# Altium footprint library ADP_Misc.PcbLib: 41 footprints (part 2 of 3)
Each footprint in its own frame and in the unit in brackets; x right, y up, seen from the top. Pads: shape width x height; smd on the part's side, far side on the other; paste and mask are expansions set on the pad; w line width, h text height; cw(c..) or ccw(c..) is an arc to the next point about the centre after c.
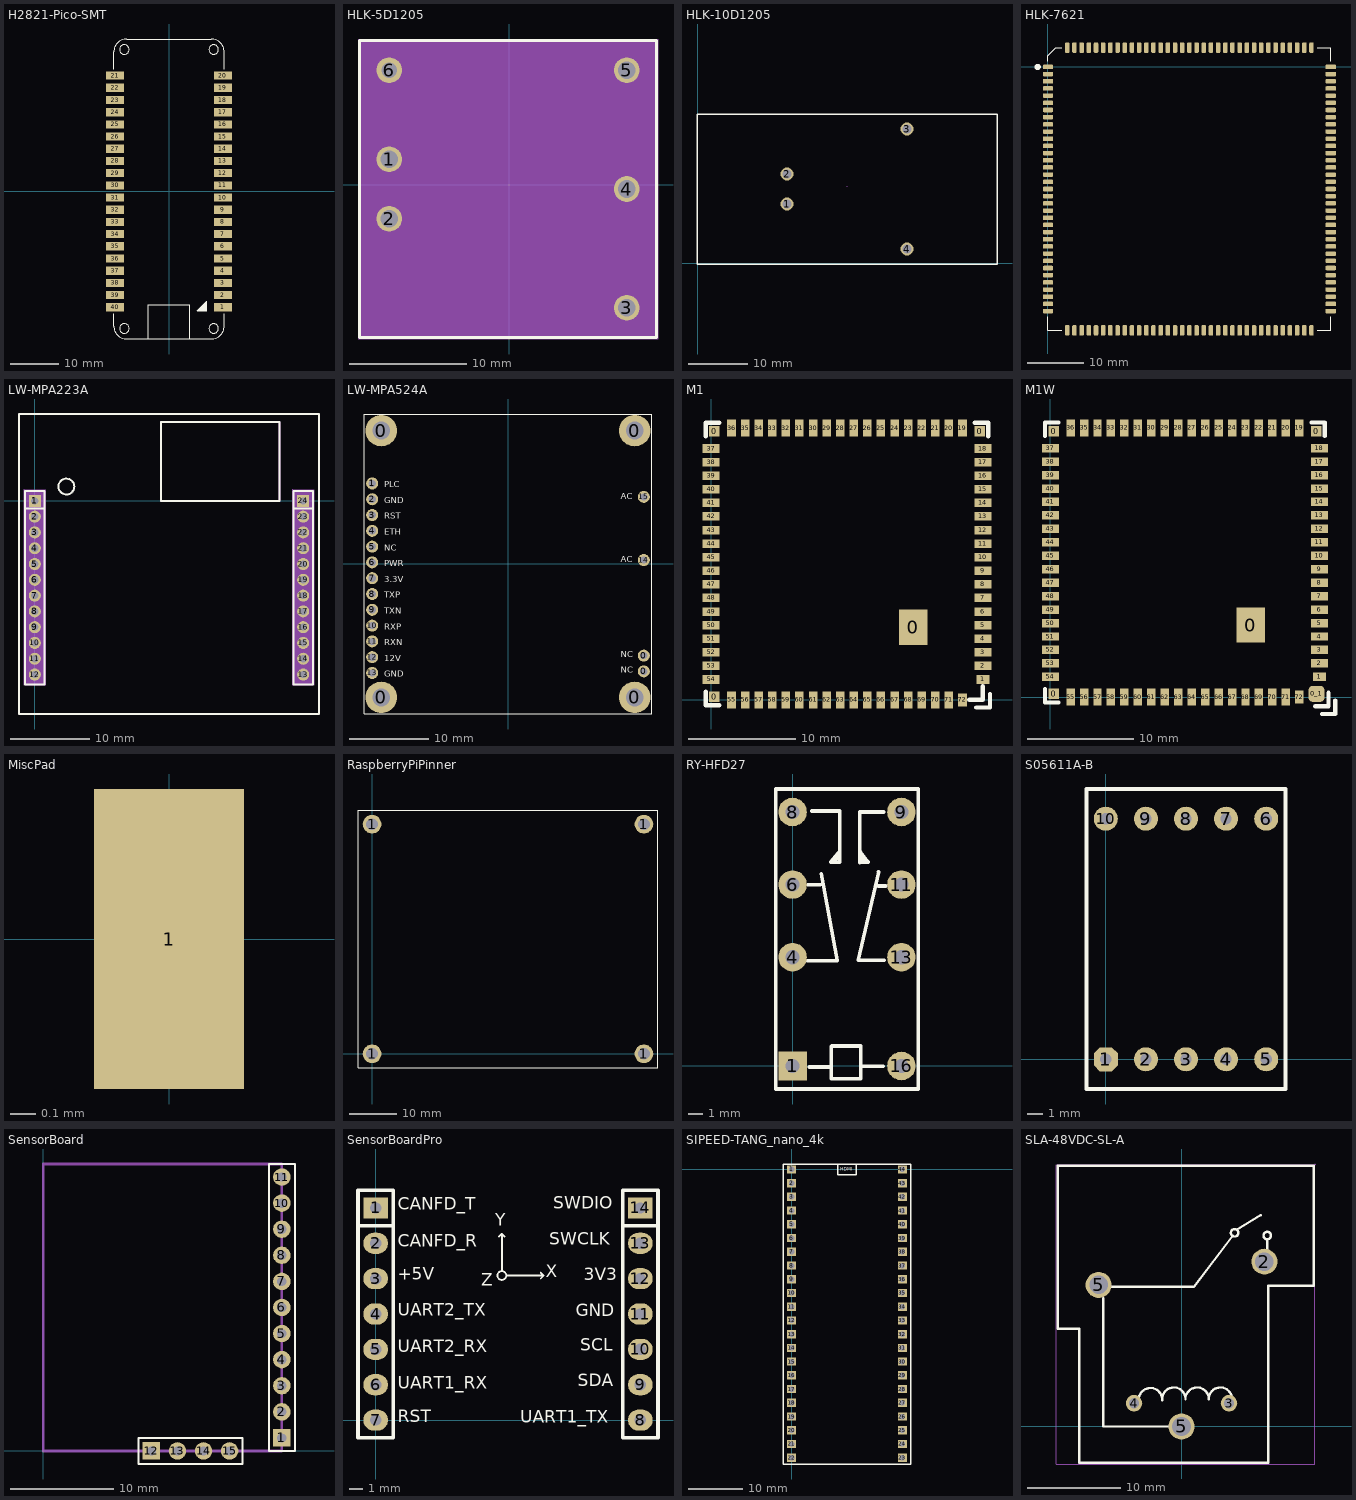
[diagram p1: the footprints below, top view; thin cyan lines are the x and y axes]

## H2821-Pico-SMT [mm]
pads (40):
  rect 3.8x1.7 smd mask+0.102: 1(11.246,-24.13) 2(11.246,-21.59) 3(11.246,-19.05) 4(11.246,-16.51) 5(11.246,-13.97) 6(11.246,-11.43) 7(11.246,-8.89) 8(11.246,-6.35) 9(11.246,-3.81) 10(11.246,-1.27) 11(11.246,1.27) 12(11.246,3.81) 13(11.246,6.35) 14(11.246,8.89) 15(11.246,11.43) 16(11.246,13.97) 17(11.246,16.51) 18(11.246,19.05) 19(11.246,21.59) 20(11.246,24.13) 21(-11.246,24.13) 22(-11.246,21.59) 23(-11.246,19.05) 24(-11.246,16.51) 25(-11.246,13.97) 26(-11.246,11.43) 27(-11.246,8.89) 28(-11.246,6.35) 29(-11.246,3.81) 30(-11.246,1.27) 31(-11.246,-1.27) 32(-11.246,-3.81) 33(-11.246,-6.35) 34(-11.246,-8.89) 35(-11.246,-11.43) 36(-11.246,-13.97) 37(-11.246,-16.51) 38(-11.246,-19.05) 39(-11.246,-21.59) 40(-11.246,-24.13)
Top Overlay:
  circle w0.102: c-9.312,29.568 r1
  circle w0.102: c9.308,29.568 r1
  circle w0.102: c9.308,-28.548 r1
  circle w0.102: c-9.308,-28.548 r1
  region: 5.842,-24.89 7.874,-24.89 7.874,-22.858
  lines w0.254: -11.5,-25.5 -11.5,-28.04 ccw(c-8.8,-28.04) -8.8,-30.74 8.8,-30.74 ccw(c8.8,-28.04) 11.5,-28.04 11.5,-25.5 ; -11.5,25.427 -11.5,29.06 cw(c-8.8,29.06) -8.8,31.76 8.8,31.76 cw(c8.8,29.06) 11.5,29.06 11.5,25.427 ; -4.318,-30.74 4.318,-30.74 4.318,-23.628 -4.318,-23.628 -4.318,-30.74 ; 5.842,-24.89 7.874,-24.89 7.874,-22.858 5.842,-24.89

## HLK-5D1205 [mil]
pads (6):
  round 86.61 hole 59.06: 1(-405,85) 2(-405,-115) 3(395,-415) 4(395,-15) 5(395,385)
  round 86.61 hole 52: 6(-405,385)
Top Overlay:
  lines w10: -505,-515 495,-515 495,485 -505,485 -505,-515
Mechanical 4:
  region: -510,490 500,490 500,-520 -510,-520
Mechanical 5:
  region: -448.31,128.31 -361.69,128.31 -361.69,41.69 -448.31,41.69
  region: -448.31,-71.69 -361.69,-71.69 -361.69,-158.31 -448.31,-158.31
  region: -448.31,428.31 -361.69,428.31 -361.69,341.69 -448.31,341.69
  region: 351.69,428.31 438.31,428.31 438.31,341.69 351.69,341.69
  region: 351.69,-371.69 438.31,-371.69 438.31,-458.31 351.69,-458.31
  region: 351.69,28.31 438.31,28.31 438.31,-58.31 351.69,-58.31
Mechanical 15:
  lines w0.1: -6,2.75 -4,4.75

## HLK-10D1205 [mm]
pads (4):
  round 2.2 hole 1.5: 1(15.113,10.033) 2(15.113,15.113) 3(35.433,22.733) 4(35.433,2.413)
Top Overlay:
  lines w0.254: -0.127,-0.127 50.673,-0.127 50.673,25.273 -0.127,25.273 -0.127,-0.127
Mechanical 15:
  lines w0.003: 25.273,13.049 25.273,13.05

## HLK-7621 [mm]
height 1
pads (141):
  rrect50% 1.85x0.8 smd: 1(0,0) 2(0,-1.27) 3(0,-2.54) 4(0,-3.81) 5(0,-5.08) 6(0,-6.35) 7(0,-7.62) 8(0,-8.89) 9(0,-10.16) 10(0,-11.43) 11(0,-12.7) 12(0,-13.97) 13(0,-15.24) 14(0,-16.51) 15(0,-17.78) 16(0,-19.05) 17(0,-20.32) 18(0,-21.59) 19(0,-22.86) 20(0,-24.13) 21(0,-25.4) 22(0,-26.67) 23(0,-27.94) 24(0,-29.21) 25(0,-30.48) 26(0,-31.75) 27(0,-33.02) 28(0,-34.29) 29(0,-35.56) 30(0,-36.83) 31(0,-38.1) 32(0,-39.37) 33(0,-40.64) 34(0,-41.91) 35(0,-43.18) 71(50,-43.18) 72(50,-41.91) 73(50,-40.64) 74(50,-39.37) 75(50,-38.1) 76(50,-36.83) 77(50,-35.56) 78(50,-34.29) 79(50,-33.02) 80(50,-31.75) 81(50,-30.48) 82(50,-29.21) 83(50,-27.94) 84(50,-26.67) 85(50,-25.4) 86(50,-24.13) 87(50,-22.86) 88(50,-21.59) 89(50,-20.32) 90(50,-19.05) 91(50,-17.78) 92(50,-16.51) 93(50,-15.24) 94(50,-13.97) 95(50,-12.7) 96(50,-11.43) 97(50,-10.16) 98(50,-8.89) 99(50,-7.62) 100(50,-6.35) 101(50,-5.08) 102(50,-3.81) 103(50,-2.54) 104(50,-1.27) 105(50,0)
  rrect50% 0.8x1.85 smd: 36(3.41,-46.59) 37(4.68,-46.59) 38(5.95,-46.59) 39(7.22,-46.59) 40(8.49,-46.59) 41(9.76,-46.59) 42(11.03,-46.59) 43(12.3,-46.59) 44(13.57,-46.59) 45(14.84,-46.59) 46(16.11,-46.59) 47(17.38,-46.59) 48(18.65,-46.59) 49(19.92,-46.59) 50(21.19,-46.59) 51(22.46,-46.59) 52(23.73,-46.59) 53(25,-46.59) 54(26.27,-46.59) 55(27.54,-46.59) 56(28.81,-46.59) 56(28.81,-46.59) 57(30.08,-46.59) 58(31.35,-46.59) 59(32.62,-46.59) 60(33.89,-46.59) 61(35.16,-46.59) 62(36.43,-46.59) 63(37.7,-46.59) 64(38.97,-46.59) 65(40.24,-46.59) 66(41.51,-46.59) 67(42.78,-46.59) 68(44.05,-46.59) 69(45.32,-46.59) 70(46.59,-46.59) 106(46.59,3.41) 107(45.32,3.41) 108(44.05,3.41) 109(42.78,3.41) 110(41.51,3.41) 111(40.24,3.41) 112(38.97,3.41) 113(37.7,3.41) 114(36.43,3.41) 115(35.16,3.41) 116(33.89,3.41) 117(32.62,3.41) 118(31.35,3.41) 119(30.08,3.41) 120(28.81,3.41) 121(27.54,3.41) 122(26.27,3.41) 123(25,3.41) 124(23.73,3.41) 125(22.46,3.41) 126(21.19,3.41) 127(19.92,3.41) 128(18.65,3.41) 129(17.38,3.41) 130(16.11,3.41) 131(14.84,3.41) 132(13.57,3.41) 133(12.3,3.41) 134(11.03,3.41) 135(9.76,3.41) 136(8.49,3.41) 137(7.22,3.41) 138(5.95,3.41) 139(4.68,3.41) 140(3.41,3.41)
Top Overlay:
  circle w0.5: c-1.82,-0.014 r0.3
  lines w0.15: 0,-44.18 0,-46.59 2.41,-46.59 ; 0,1 0,2 1.41,3.41 2.41,3.41 ; 47.59,-46.59 50,-46.59 50,-44.18 ; 47.59,3.41 50,3.41 50,1

## LW-MPA223A [mil]
pads (24):
  rect 60x60 hole 35.43: 1(0,0) 24(1338.58,0)
  round 60 hole 35.43: 2(0,-78.8) 3(0,-157.5) 4(0,-236.3) 5(0,-315) 6(0,-393.7) 7(0,-472.5) 8(0,-551.2) 9(0,-630) 10(0,-708.7) 11(0,-787.4) 12(0,-866.2) 13(1338.58,-866.2) 14(1338.58,-787.4) 15(1338.58,-708.7) 16(1338.58,-630) 17(1338.58,-551.2) 18(1338.58,-472.5) 19(1338.58,-393.7) 20(1338.58,-315) 21(1338.58,-236.3) 22(1338.58,-157.5) 23(1338.58,-78.8)
Top Overlay:
  circle w10: c157.48,71.26 r39.37
  lines w10: -49.21,-39.36 49.21,-39.36 ; 1289.37,-39.36 1387.79,-39.36 ; -78.74,-1062.99 0,-1062.99 1377.95,-1062.99 1417.32,-1062.99 1417.32,433.07 -78.74,433.07 -78.74,-1062.99 ; -49.21,-915.38 49.21,-915.38 49.2,-591 49.2,49.2 -49.21,49.18 -49.21,-915.38 ; 629.92,0 629.92,393.7 1220.47,393.7 1220.47,0 629.92,0 ; 1289.37,-915.38 1289.37,49.18 1387.79,49.18 1387.78,-591 1387.78,-915.4 1289.37,-915.38
Mechanical 1:
  lines w10: 629.92,0 1220.47,0 1220.47,393.7 629.92,393.7 629.92,0
Mechanical 4:
  region: 1392.79,54.2 1392.79,-920.4 1284.37,-920.4 1284.37,54.2
  region: 54.21,54.2 54.21,-920.4 -54.21,-920.4 -54.21,54.2
Mechanical 5:
  circle w13.78: c1338.58,-866.2 r6.89
  circle w13.78: c1338.58,-787.4 r6.89
  circle w13.78: c1338.58,-708.7 r6.89
  circle w13.78: c1338.58,-630 r6.89
  circle w13.78: c1338.58,-551.2 r6.89
  circle w13.78: c1338.58,-472.5 r6.89
  circle w13.78: c1338.58,-393.7 r6.89
  circle w13.78: c1338.58,-315 r6.89
  circle w13.78: c1338.58,-236.3 r6.89
  circle w13.78: c1338.58,-157.5 r6.89
  circle w13.78: c1338.58,-78.8 r6.89
  circle w13.78: c1338.58,0 r6.89
  circle w13.78: c0,0 r6.89
  circle w13.78: c0,-78.8 r6.89
  circle w13.78: c0,-157.5 r6.89
  circle w13.78: c0,-236.3 r6.89
  circle w13.78: c0,-315 r6.89
  circle w13.78: c0,-393.7 r6.89
  circle w13.78: c0,-472.5 r6.89
  circle w13.78: c0,-551.2 r6.89
  circle w13.78: c0,-630 r6.89
  circle w13.78: c0,-708.7 r6.89
  circle w13.78: c0,-787.4 r6.89
  circle w13.78: c0,-866.2 r6.89
Mechanical 6:
  circle w2.36: c1284.37,54.2 r1.18
  circle w2.36: c-54.21,54.2 r1.18
Mechanical 15:
  lines w0.1: 17.55,-431.51 19.55,-433.51 ; 1356.14,-431.51 1358.14,-433.51

## LW-MPA524A [mil]
height 51.18
pads (21):
  round 157.48 hole 88.58: 0(-631.89,-665.35) 0(-631.89,665.35) 0(631.89,665.35) 0(631.89,-665.35)
  round 60 hole 36: 0(677.17,-456.69) 0(677.17,-535.43) 1(-677.16,401.57) 2(-677.16,322.84) 3(-677.17,244.09) 4(-677.16,165.35) 5(-677.17,86.61) 6(-677.16,7.87) 7(-677.16,-70.87) 8(-677.16,-149.61) 9(-677.17,-228.35) 10(-677.17,-307.09) 11(-677.17,-385.83) 12(-677.17,-464.57) 13(-677.17,-543.31) 14(677.17,19.68) 15(677.16,334.65)
Top Overlay:
  lines w5: -716.54,-748.03 -716.54,748.03 716.54,748.03 716.53,-748.03 -716.54,-748.03
  text "NC" at 562.99,-543.31 h31.5
  text "NC" at 562.99,-464.57 h31.5
  text "AC" at 562.99,7.87 h31.5
  text "AC" at 562.99,322.83 h31.5
  text "GND" at -618.11,-562.99 h31.5
  text "RXN" at -618.11,-405.51 h31.5
  text "RXP" at -618.11,-326.77 h31.5
  text "TXN" at -618.11,-248.03 h31.5
  text "TXP" at -618.11,-169.29 h31.5
  text "3.3V" at -618.11,-90.55 h31.5
  text "PWR" at -618.11,-11.81 h31.5
  text "PLC" at -618.11,381.89 h31.5
  text "GND" at -618.11,303.15 h31.5
  text "RST" at -618.11,224.41 h31.5
  text "ETH" at -618.11,145.67 h31.5
  text "NC" at -618.11,66.93 h31.5
  text "12V" at -618.11,-484.25 h31.5
3D body "PLC.STEP": height 169.29, standoff -342.52, extent -728.34,-748.03 728.35,748.04

## M1 [mm]
height 8.2
pads (76):
  rect 1x1 smd mask+0.051: 0(0.3,0.3) 0(0.3,25.1) 0(25.1,25.1)
  rect 2.667x3.302 smd mask+0.051: 0(18.9,6.8)
  rect 1.2x0.8 smd mask+0.051: 1(25.4,1.905)
  rect 1.6x0.8 smd mask+0.051: 2(25.4,3.175) 3(25.4,4.445) 4(25.4,5.715) 5(25.4,6.985) 6(25.4,8.255) 7(25.4,9.525) 8(25.4,10.795) 9(25.4,12.065) 10(25.4,13.335) 11(25.4,14.605) 12(25.4,15.875) 13(25.4,17.145) 14(25.4,18.415) 15(25.4,19.685) 16(25.4,20.955) 17(25.4,22.225) 18(25.4,23.495) 37(0,23.495) 38(0,22.225) 39(0,20.955) 40(0,19.685) 41(0,18.415) 42(0,17.145) 43(0,15.875) 44(0,14.605) 45(0,13.335) 46(0,12.065) 47(0,10.795) 48(0,9.525) 49(0,8.255) 50(0,6.985) 51(0,5.715) 52(0,4.445) 53(0,3.175) 54(0,1.905)
  rect 0.8x1.6 smd mask+0.051: 19(23.495,25.4) 20(22.225,25.4) 21(20.955,25.4) 22(19.685,25.4) 23(18.415,25.4) 24(17.145,25.4) 25(15.875,25.4) 26(14.605,25.4) 27(13.335,25.4) 28(12.065,25.4) 29(10.795,25.4) 30(9.525,25.4) 31(8.255,25.4) 32(6.985,25.4) 33(5.715,25.4) 34(4.445,25.4) 35(3.175,25.4) 36(1.905,25.4) 55(1.905,0) 56(3.175,0) 57(4.445,0) 58(5.715,0) 59(6.985,0) 60(8.255,0) 61(9.525,0) 62(10.795,0) 63(12.065,0) 64(13.335,0) 65(14.605,0) 66(15.875,0) 67(17.145,0) 68(18.415,0) 69(19.685,0) 70(20.955,0) 71(22.225,0)
  rect 0.8x1.2 smd mask+0.051: 72(23.495,0)
Top Overlay:
  lines w0.4: -0.508,0.762 -0.508,-0.508 0.762,-0.508 ; -0.508,24.638 -0.508,25.908 0.762,25.908 ; 24.13,0 25.4,0 25.4,1.27 ; 24.638,25.908 25.908,25.908 25.908,24.638 ; 24.79,-0.711 26.06,-0.711 26.06,0.559
Top Paste:
  region: 1.504,-0.541 1.504,-1.3 2.304,-1.3 2.304,-0.541
  region: 2.774,-0.541 2.774,-1.3 3.574,-1.3 3.574,-0.541
  region: 5.314,-0.541 5.314,-1.3 6.114,-1.3 6.114,-0.541
  region: 4.044,-0.541 4.044,-1.3 4.844,-1.3 4.844,-0.541
  region: 9.124,-0.541 9.124,-1.3 9.924,-1.3 9.924,-0.541
  region: 10.394,-0.541 10.394,-1.3 11.194,-1.3 11.194,-0.541
  region: 7.854,-0.541 7.854,-1.3 8.654,-1.3 8.654,-0.541
  region: 6.584,-0.541 6.584,-1.3 7.384,-1.3 7.384,-0.541
  region: 16.744,-0.541 16.744,-1.3 17.544,-1.3 17.544,-0.541
  region: 18.014,-0.541 18.014,-1.3 18.814,-1.3 18.814,-0.541
  region: 20.554,-0.541 20.554,-1.3 21.354,-1.3 21.354,-0.541
  region: 19.284,-0.541 19.284,-1.3 20.084,-1.3 20.084,-0.541
  region: 14.204,-0.541 14.204,-1.3 15.004,-1.3 15.004,-0.541
  region: 15.474,-0.541 15.474,-1.3 16.274,-1.3 16.274,-0.541
  region: 12.934,-0.541 12.934,-1.3 13.734,-1.3 13.734,-0.541
  region: 11.664,-0.541 11.664,-1.3 12.464,-1.3 12.464,-0.541
  region: 21.824,-0.541 21.824,-1.3 22.624,-1.3 22.624,-0.541
  region: 23.094,-0.541 23.094,-1.3 23.894,-1.3 23.894,-0.541
  region: -0.541,23.896 -1.3,23.896 -1.3,23.096 -0.541,23.096
  region: -0.541,22.626 -1.3,22.626 -1.3,21.826 -0.541,21.826
  region: -0.541,20.086 -1.3,20.086 -1.3,19.286 -0.541,19.286
  region: -0.541,21.356 -1.3,21.356 -1.3,20.556 -0.541,20.556
  region: -0.541,16.276 -1.3,16.276 -1.3,15.476 -0.541,15.476
  region: -0.541,15.006 -1.3,15.006 -1.3,14.206 -0.541,14.206
  region: -0.541,17.546 -1.3,17.546 -1.3,16.746 -0.541,16.746
  region: -0.541,18.816 -1.3,18.816 -1.3,18.016 -0.541,18.016
  region: -0.541,8.656 -1.3,8.656 -1.3,7.856 -0.541,7.856
  region: -0.541,7.386 -1.3,7.386 -1.3,6.586 -0.541,6.586
  region: -0.541,4.846 -1.3,4.846 -1.3,4.046 -0.541,4.046
  region: -0.541,6.116 -1.3,6.116 -1.3,5.316 -0.541,5.316
  region: -0.541,11.196 -1.3,11.196 -1.3,10.396 -0.541,10.396
  region: -0.541,9.926 -1.3,9.926 -1.3,9.126 -0.541,9.126
  region: -0.541,12.466 -1.3,12.466 -1.3,11.666 -0.541,11.666
  region: -0.541,13.736 -1.3,13.736 -1.3,12.936 -0.541,12.936
  region: -0.541,3.576 -1.3,3.576 -1.3,2.776 -0.541,2.776
  region: -0.541,2.306 -1.3,2.306 -1.3,1.506 -0.541,1.506
  region: 23.896,25.941 23.896,26.7 23.096,26.7 23.096,25.941
  region: 22.626,25.941 22.626,26.7 21.826,26.7 21.826,25.941
  region: 20.086,25.941 20.086,26.7 19.286,26.7 19.286,25.941
  region: 21.356,25.941 21.356,26.7 20.556,26.7 20.556,25.941
  region: 16.276,25.941 16.276,26.7 15.476,26.7 15.476,25.941
  region: 15.006,25.941 15.006,26.7 14.206,26.7 14.206,25.941
  region: 17.546,25.941 17.546,26.7 16.746,26.7 16.746,25.941
  region: 18.816,25.941 18.816,26.7 18.016,26.7 18.016,25.941
  region: 8.656,25.941 8.656,26.7 7.856,26.7 7.856,25.941
  region: 7.386,25.941 7.386,26.7 6.586,26.7 6.586,25.941
  region: 4.846,25.941 4.846,26.7 4.046,26.7 4.046,25.941
  region: 6.116,25.941 6.116,26.7 5.316,26.7 5.316,25.941
  region: 11.196,25.941 11.196,26.7 10.396,26.7 10.396,25.941
  region: 9.926,25.941 9.926,26.7 9.126,26.7 9.126,25.941
  region: 12.466,25.941 12.466,26.7 11.666,26.7 11.666,25.941
  region: 13.736,25.941 13.736,26.7 12.936,26.7 12.936,25.941
  region: 3.576,25.941 3.576,26.7 2.776,26.7 2.776,25.941
  region: 2.306,25.941 2.306,26.7 1.506,26.7 1.506,25.941
  rectangle: 25.941,23.094 26.7,23.894
  rectangle: 25.941,21.824 26.7,22.624
  rectangle: 25.941,11.664 26.7,12.464
  rectangle: 25.941,12.934 26.7,13.734
  rectangle: 25.941,15.474 26.7,16.274
  rectangle: 25.941,14.204 26.7,15.004
  rectangle: 25.941,19.284 26.7,20.084
  rectangle: 25.941,20.554 26.7,21.354
  rectangle: 25.941,18.014 26.7,18.814
  rectangle: 25.941,16.744 26.7,17.544
  rectangle: 25.941,6.584 26.7,7.384
  rectangle: 25.941,7.854 26.7,8.654
  rectangle: 25.941,10.394 26.7,11.194
  rectangle: 25.941,9.124 26.7,9.924
  rectangle: 25.941,4.044 26.7,4.844
  rectangle: 25.941,5.314 26.7,6.114
  rectangle: 25.941,2.774 26.7,3.574
  rectangle: 25.941,1.504 26.7,2.304
  rectangle: -0.587,24.6 0.8,25.994
  region: 0.8,-0.587 0.8,0.8 -0.594,0.8 -0.594,-0.587
  region: 24.6,25.987 24.6,24.6 25.994,24.6 25.994,25.987
  rectangle: 24.387,-0.889 26.284,1.034
3D body "K210 core.step": height 3, standoff 0.2, extent 0,0 25.4,25.4

## M1W [mm]
height 8.2
pads (77):
  rect 1x1 smd mask+0.051: 0(0.3,0.3) 0(0.3,25.1) 0(25.1,25.1)
  rect 2.667x3.302 smd mask+0.051: 0(18.9,6.8)
  rrect50% 1.5x1.5 smd mask+0.051: 0_1(25.123,0.3)
  rect 1.2x0.8 smd mask+0.051: 1(25.4,1.905)
  rect 1.6x0.8 smd mask+0.051: 2(25.4,3.175) 3(25.4,4.445) 4(25.4,5.715) 5(25.4,6.985) 6(25.4,8.255) 7(25.4,9.525) 8(25.4,10.795) 9(25.4,12.065) 10(25.4,13.335) 11(25.4,14.605) 12(25.4,15.875) 13(25.4,17.145) 14(25.4,18.415) 15(25.4,19.685) 16(25.4,20.955) 17(25.4,22.225) 18(25.4,23.495) 37(0,23.495) 38(0,22.225) 39(0,20.955) 40(0,19.685) 41(0,18.415) 42(0,17.145) 43(0,15.875) 44(0,14.605) 45(0,13.335) 46(0,12.065) 47(0,10.795) 48(0,9.525) 49(0,8.255) 50(0,6.985) 51(0,5.715) 52(0,4.445) 53(0,3.175) 54(0,1.905)
  rect 0.8x1.6 smd mask+0.051: 19(23.495,25.4) 20(22.225,25.4) 21(20.955,25.4) 22(19.685,25.4) 23(18.415,25.4) 24(17.145,25.4) 25(15.875,25.4) 26(14.605,25.4) 27(13.335,25.4) 28(12.065,25.4) 29(10.795,25.4) 30(9.525,25.4) 31(8.255,25.4) 32(6.985,25.4) 33(5.715,25.4) 34(4.445,25.4) 35(3.175,25.4) 36(1.905,25.4) 55(1.905,0) 56(3.175,0) 57(4.445,0) 58(5.715,0) 59(6.985,0) 60(8.255,0) 61(9.525,0) 62(10.795,0) 63(12.065,0) 64(13.335,0) 65(14.605,0) 66(15.875,0) 67(17.145,0) 68(18.415,0) 69(19.685,0) 70(20.955,0) 71(22.225,0)
  rect 0.8x1.2 smd mask+0.051: 72(23.495,0)
Top Overlay:
  lines w0.4: -0.508,0.762 -0.508,-0.508 0.762,-0.508 ; -0.508,24.638 -0.508,25.908 0.762,25.908 ; 24.638,25.908 25.908,25.908 25.908,24.638 ; 24.994,-0.864 26.264,-0.864 26.264,0.406 ; 25.629,-1.6 26.899,-1.6 26.899,-0.33
Top Paste:
  region: 1.504,-0.541 1.504,-1.3 2.304,-1.3 2.304,-0.541
  region: 2.774,-0.541 2.774,-1.3 3.574,-1.3 3.574,-0.541
  region: 5.314,-0.541 5.314,-1.3 6.114,-1.3 6.114,-0.541
  region: 4.044,-0.541 4.044,-1.3 4.844,-1.3 4.844,-0.541
  region: 9.124,-0.541 9.124,-1.3 9.924,-1.3 9.924,-0.541
  region: 10.394,-0.541 10.394,-1.3 11.194,-1.3 11.194,-0.541
  region: 7.854,-0.541 7.854,-1.3 8.654,-1.3 8.654,-0.541
  region: 6.584,-0.541 6.584,-1.3 7.384,-1.3 7.384,-0.541
  region: 16.744,-0.541 16.744,-1.3 17.544,-1.3 17.544,-0.541
  region: 18.014,-0.541 18.014,-1.3 18.814,-1.3 18.814,-0.541
  region: 20.554,-0.541 20.554,-1.3 21.354,-1.3 21.354,-0.541
  region: 19.284,-0.541 19.284,-1.3 20.084,-1.3 20.084,-0.541
  region: 14.204,-0.541 14.204,-1.3 15.004,-1.3 15.004,-0.541
  region: 15.474,-0.541 15.474,-1.3 16.274,-1.3 16.274,-0.541
  region: 12.934,-0.541 12.934,-1.3 13.734,-1.3 13.734,-0.541
  region: 11.664,-0.541 11.664,-1.3 12.464,-1.3 12.464,-0.541
  region: 21.824,-0.541 21.824,-1.3 22.624,-1.3 22.624,-0.541
  region: 23.094,-0.541 23.094,-1.3 23.894,-1.3 23.894,-0.541
  region: -0.541,23.896 -1.3,23.896 -1.3,23.096 -0.541,23.096
  region: -0.541,22.626 -1.3,22.626 -1.3,21.826 -0.541,21.826
  region: -0.541,20.086 -1.3,20.086 -1.3,19.286 -0.541,19.286
  region: -0.541,21.356 -1.3,21.356 -1.3,20.556 -0.541,20.556
  region: -0.541,16.276 -1.3,16.276 -1.3,15.476 -0.541,15.476
  region: -0.541,15.006 -1.3,15.006 -1.3,14.206 -0.541,14.206
  region: -0.541,17.546 -1.3,17.546 -1.3,16.746 -0.541,16.746
  region: -0.541,18.816 -1.3,18.816 -1.3,18.016 -0.541,18.016
  region: -0.541,8.656 -1.3,8.656 -1.3,7.856 -0.541,7.856
  region: -0.541,7.386 -1.3,7.386 -1.3,6.586 -0.541,6.586
  region: -0.541,4.846 -1.3,4.846 -1.3,4.046 -0.541,4.046
  region: -0.541,6.116 -1.3,6.116 -1.3,5.316 -0.541,5.316
  region: -0.541,11.196 -1.3,11.196 -1.3,10.396 -0.541,10.396
  region: -0.541,9.926 -1.3,9.926 -1.3,9.126 -0.541,9.126
  region: -0.541,12.466 -1.3,12.466 -1.3,11.666 -0.541,11.666
  region: -0.541,13.736 -1.3,13.736 -1.3,12.936 -0.541,12.936
  region: -0.541,3.576 -1.3,3.576 -1.3,2.776 -0.541,2.776
  region: -0.541,2.306 -1.3,2.306 -1.3,1.506 -0.541,1.506
  region: 23.896,25.941 23.896,26.7 23.096,26.7 23.096,25.941
  region: 22.626,25.941 22.626,26.7 21.826,26.7 21.826,25.941
  region: 20.086,25.941 20.086,26.7 19.286,26.7 19.286,25.941
  region: 21.356,25.941 21.356,26.7 20.556,26.7 20.556,25.941
  region: 16.276,25.941 16.276,26.7 15.476,26.7 15.476,25.941
  region: 15.006,25.941 15.006,26.7 14.206,26.7 14.206,25.941
  region: 17.546,25.941 17.546,26.7 16.746,26.7 16.746,25.941
  region: 18.816,25.941 18.816,26.7 18.016,26.7 18.016,25.941
  region: 8.656,25.941 8.656,26.7 7.856,26.7 7.856,25.941
  region: 7.386,25.941 7.386,26.7 6.586,26.7 6.586,25.941
  region: 4.846,25.941 4.846,26.7 4.046,26.7 4.046,25.941
  region: 6.116,25.941 6.116,26.7 5.316,26.7 5.316,25.941
  region: 11.196,25.941 11.196,26.7 10.396,26.7 10.396,25.941
  region: 9.926,25.941 9.926,26.7 9.126,26.7 9.126,25.941
  region: 12.466,25.941 12.466,26.7 11.666,26.7 11.666,25.941
  region: 13.736,25.941 13.736,26.7 12.936,26.7 12.936,25.941
  region: 3.576,25.941 3.576,26.7 2.776,26.7 2.776,25.941
  region: 2.306,25.941 2.306,26.7 1.506,26.7 1.506,25.941
  rectangle: 25.941,23.094 26.7,23.894
  rectangle: 25.941,21.824 26.7,22.624
  rectangle: 25.941,11.664 26.7,12.464
  rectangle: 25.941,12.934 26.7,13.734
  rectangle: 25.941,15.474 26.7,16.274
  rectangle: 25.941,14.204 26.7,15.004
  rectangle: 25.941,19.284 26.7,20.084
  rectangle: 25.941,20.554 26.7,21.354
  rectangle: 25.941,18.014 26.7,18.814
  rectangle: 25.941,16.744 26.7,17.544
  rectangle: 25.941,6.584 26.7,7.384
  rectangle: 25.941,7.854 26.7,8.654
  rectangle: 25.941,10.394 26.7,11.194
  rectangle: 25.941,9.124 26.7,9.924
  rectangle: 25.941,4.044 26.7,4.844
  rectangle: 25.941,5.314 26.7,6.114
  rectangle: 25.941,2.774 26.7,3.574
  rectangle: 25.941,1.504 26.7,2.304
  rectangle: -0.587,24.6 0.8,25.994
  region: 0.8,-0.587 0.8,0.8 -0.594,0.8 -0.594,-0.587
  region: 24.6,25.987 24.6,24.6 25.994,24.6 25.994,25.987
  rectangle: 24.387,-0.889 26.284,1.034
3D body "K210 core.step": height 3, standoff 0.2, extent 0,0 25.4,25.4

## MiscPad [mm] "MiscPad"
pads (1):
  rect 0.6x1.2 smd: 1(0,0)

## RaspberryPiPinner [mm] "树莓派定位孔"
pads (4):
  round 4 hole 2.5: 1(0,0) 1(0,49) 1(58,0) 1(58,49)
Top Overlay:
  lines w0.254: -3,-3 -3,52 61,52 61,-3 0,-3 -3,-3

## RY-HFD27 [mm]
pads (8):
  rect 2x2 hole 1: 1(0,0)
  round 2 hole 1: 4(0,7.62) 6(0,12.7) 8(0,17.78) 9(7.62,17.78) 11(7.62,12.7) 13(7.62,7.62) 16(7.62,0)
Top Overlay:
  lines w0.254: 1.022,7.375 3.128,7.375 2.004,13.46 ; 1.058,12.693 1.932,12.693 ; 1.183,-0.066 2.629,-0.066 ; 1.344,17.85 3.307,17.85 3.306,14.263 2.664,14.263 3.217,14.923 3.021,14.406 ; 4.734,15.013 5.287,14.281 5.269,14.263 4.698,14.245 4.699,17.779 6.394,17.779 ; 4.805,14.781 4.966,14.352 ; 4.877,-0.013 6.34,-0.013 ; 6.001,12.604 6.519,12.604 ; 6.019,13.585 4.609,7.411 6.429,7.411 ; -1.19,-1.61 8.81,-1.61 8.81,19.39 -1.19,19.39 -1.19,-1.61 ; 2.7,-0.887 2.7,1.076 2.7,1.361 2.736,1.397 4.77,1.397 4.77,-0.869 4.752,-0.887 2.7,-0.887
3D body "User Library-OMRON G5V-2.STEP": height 10.92, standoff -4, extent -1.143,-1.27 8.857,19.13

## S05611A-B [mil]
pads (10):
  oct 60x60 hole 28: 1(0,0)
  round 60 hole 28: 2(100,0) 3(200,0) 4(300,0) 5(400,0) 6(400,600) 7(300,600) 8(200,600) 9(100,600) 10(0,600)
Top Overlay:
  lines w10: -48.03,-74.02 -48.03,674.02 448.03,674.02 448.03,-74.02 -48.03,-74.02
  text ".56'" at 100,280 h60
3D body "S5611A-B.STEP": height 316.25, standoff -156.19, extent -50,-75 450,675

## SensorBoard [mm] "舱温水深传感器解算板"
pads (15):
  rect 1.7x1.7 hole 0.9: 1(23.241,1.27) 12(10.541,0)
  round 1.7 hole 0.9: 2(23.241,3.81) 3(23.241,6.35) 4(23.241,8.89) 5(23.241,11.43) 6(23.241,13.97) 7(23.241,16.51) 8(23.241,19.05) 9(23.241,21.59) 10(23.241,24.13) 11(23.241,26.67) 13(13.081,0) 14(15.621,0) 15(18.161,0)
Top Overlay:
  lines w0.2: 9.271,-1.27 9.271,1.27 19.431,1.27 19.431,-1.27 9.271,-1.27 ; 21.971,0 24.511,0 24.511,27.94 21.971,27.94 21.971,0
Mechanical 1:
  lines w0.254: 0,0 23.241,0 23.241,8.382 23.241,27.94 0,27.94 0,8.382 0,0
3D body "HDR2.54-1P.STEP": height 8.5, standoff -3, extent 21.971,25.4 24.511,27.94
3D body "HDR2.54-1P.STEP": height 8.5, standoff -3, extent 21.971,22.86 24.511,25.4
3D body "HDR2.54-1P.STEP": height 8.5, standoff -3, extent 21.971,17.78 24.511,20.32
3D body "HDR2.54-1P.STEP": height 8.5, standoff -3, extent 21.971,20.32 24.511,22.86
3D body "HDR2.54-1P.STEP": height 8.5, standoff -3, extent 21.971,12.7 24.511,15.24
3D body "HDR2.54-1P.STEP": height 8.5, standoff -3, extent 21.971,15.24 24.511,17.78
3D body "HDR2.54-1P.STEP": height 8.5, standoff -3, extent 21.971,10.16 24.511,12.7
3D body "HDR2.54-1P.STEP": height 8.5, standoff -3, extent 21.971,5.08 24.511,7.62
3D body "HDR2.54-1P.STEP": height 8.5, standoff -3, extent 21.971,7.62 24.511,10.16
3D body "HDR2.54-1P.STEP": height 8.5, standoff -3, extent 21.971,0 24.511,2.54
3D body "HDR2.54-1P.STEP": height 8.5, standoff -3, extent 21.971,2.54 24.511,5.08
3D body "HDR2.54-1P.STEP": height 8.5, standoff -3, extent 9.271,-1.27 11.811,1.27
3D body "HDR2.54-1P.STEP": height 8.5, standoff -3, extent 11.811,-1.27 14.351,1.27
3D body "HDR2.54-1P.STEP": height 8.5, standoff -3, extent 14.351,-1.27 16.891,1.27
3D body "HDR2.54-1P.STEP": height 8.5, standoff -3, extent 16.891,-1.27 19.431,1.27

## SensorBoardPro [mil] "常用传感器解算板"
pads (14):
  rect 70x60 hole 32: 1(0,600) 14(748.4,600)
  oval 70x60 hole 32: 2(0,500) 3(0,400) 4(0,300) 5(0,200) 6(0,100) 7(0,0) 8(748.4,0) 9(748.4,100) 10(748.4,200) 11(748.4,300) 12(748.4,400) 13(748.4,500)
Top Overlay:
  circle w5: c356.86,408.82 r12.45
  lines w5: 348.51,518.58 356.86,526.93 ; 356.86,421.27 356.86,526.93 ; 365.21,518.58 356.86,526.93 ; 369.31,408.82 474.97,408.82 ; 466.62,400.47 474.97,408.82 ; 466.62,417.17 474.97,408.82
  lines w10: -50,550 50,550 ; 698.4,550 798.4,550 ; -50,-50 -50,650 50,650 50,-50 -50,-50 ; 698.4,-50 698.4,650 798.4,650 798.4,-50 698.4,-50
  text "UART1_TX" at 409.03,-20.86 h60
  text "SDA" at 570.87,83.31 h60
  text "SCL" at 578.75,183.98 h60
  text "GND" at 565.26,280.85 h60
  text "3V3" at 588.02,382.26 h60
  text "SWCLK" at 490.5,483.05 h60
  text "RST" at 62.99,-18.38 h60
  text "UART1_RX" at 62.99,75.31 h60
  text "UART2_RX" at 62.99,178.48 h60
  text "UART2_TX" at 62.99,281.65 h60
  text "+5V" at 62.99,384.81 h60
  text "CANFD_R" at 62.99,477.83 h60
  text "SWDIO" at 501.77,584.4 h60
  text "CANFD_T" at 62.99,581.5 h60
  text "X" at 480.31,391.68 h60
  text "Y" at 338.61,537.35 h60
  text "Z" at 299.21,366.48 h60
3D body "Female-Header-2.54-Single-7.stp": height 125.98, standoff -334.65, extent 699.2,-54.92 797.62,654.92
3D body "Female-Header-2.54-Single-7.stp": height 125.98, standoff -334.65, extent -49.21,-54.92 49.22,654.92

## SIPEED-TANG_nano_4k [mil]
pads (44):
  rect 65x60 hole 40: 1(0,0) 2(0,-100) 3(0,-200) 4(0,-300) 5(0,-400) 6(0,-500) 7(0,-600) 8(0,-700) 9(0,-800) 10(0,-900) 11(0,-1000) 12(0,-1100) 13(0,-1200) 14(0,-1300) 15(0,-1400) 16(0,-1500) 17(0,-1600) 18(0,-1700) 19(0,-1800) 20(0,-1900) 21(0,-2000) 22(0,-2100) 23(807.09,-2100) 24(807.09,-2000) 25(807.09,-1900) 26(807.09,-1800) 27(807.09,-1700) 28(807.09,-1600) 29(807.09,-1500) 30(807.09,-1400) 31(807.09,-1300) 32(807.09,-1200) 33(807.09,-1100) 34(807.09,-1000) 35(807.09,-900) 36(807.09,-800) 37(807.09,-700) 38(807.09,-600) 39(807.09,-500) 40(807.09,-400) 41(807.09,-300) 42(807.09,-200) 43(807.09,-100) 44(807.09,0)
Top Overlay:
  lines w10: 334.65,39.37 334.65,-39.37 472.44,-39.37 472.44,39.37 ; -59.06,-2145.67 -39.37,-2145.67 0,-2145.67 866.14,-2145.67 866.14,39.37 -59.06,39.37 -59.06,-2145.67
  text "HDMI" at 354.33,-19.68 h39.37

## SLA-48VDC-SL-A [mil]
pads (5):
  round 110 hole 78.8: 2(350.39,696.83)
  round 70 hole 43.4: 3(200.79,98.43) 4(-200.79,98.43)
  round 110 hole 78.74: 5(-350.39,598.43) 5(0,0)
Top Overlay:
  circle w10: c224.41,818.9 r15.8
  circle w10: c362.23,807.13 r15.8
  lines w10: -334.64,590.53 51.95,591.33 216.56,807.13 ; -330.74,543.31 -330.74,0.01 -39.4,0.01 ; -180.24,107.15 cw(c-131.21,113.44) -81.84,111.05 ; -81.84,114.95 cw(c-32.59,115.84) 16.56,118.85 ; 16.56,114.95 cw(c65.81,115.84) 114.96,118.85 ; 114.96,114.95 cw(c164.21,115.84) 213.36,118.85 ; 232.25,830.73 334.65,893.73 ; 362.25,736.23 362.25,791.33 ; 366.14,-137.81 366.14,-110.27 366.14,594.53 559.05,594.53 559.05,1102.33 -523.64,1102.33 -523.64,413.37 -433.06,413.37 -433.06,-153.57 366.14,-153.57 366.14,-74.77 366.14,-15.77
Mechanical 15:
  region: 566.42,1107.33 566.42,1108.31 565.03,1109.69 563.08,1109.69 561.69,1108.31 561.69,1107.33 561.69,1106.35 563.08,1104.97 565.03,1104.97 566.42,1106.35
  region: 385.86,696.83 385.86,701.5 383.44,710.52 378.77,718.6 372.17,725.21 364.08,729.87 355.06,732.29 345.73,732.29 336.71,729.87 328.62,725.21 322.02,718.6 317.35,710.52 314.93,701.5 314.93,696.83 314.93,692.16 317.35,683.14 322.02,675.06 328.62,668.45 336.71,663.79 345.73,661.37 355.06,661.37 364.08,663.79 372.17,668.45 378.77,675.06 383.44,683.14 385.86,692.16
  region: -314.96,598.43 -314.96,603.1 -317.37,612.11 -322.04,620.19 -328.63,626.79 -336.71,631.45 -345.73,633.87 -355.06,633.87 -364.07,631.45 -372.15,626.79 -378.75,620.19 -383.41,612.11 -385.83,603.1 -385.83,598.43 -385.83,593.76 -383.41,584.75 -378.75,576.67 -372.15,570.07 -364.07,565.41 -355.06,562.99 -345.73,562.99 -336.71,565.41 -328.63,570.07 -322.04,576.67 -317.37,584.75 -314.96,593.76
  region: -183.03,98.43 -183.03,101.96 -185.73,108.49 -190.73,113.49 -197.25,116.19 -204.32,116.19 -210.85,113.49 -215.84,108.49 -218.55,101.96 -218.55,98.43 -218.55,94.9 -215.84,88.37 -210.85,83.37 -204.32,80.67 -197.25,80.67 -190.73,83.37 -185.73,88.37 -183.03,94.9
  region: 218.55,98.43 218.55,101.96 215.85,108.49 210.85,113.49 204.32,116.19 197.25,116.19 190.73,113.49 185.73,108.49 183.03,101.96 183.03,98.43 183.03,94.9 185.73,88.37 190.73,83.37 197.25,80.67 204.32,80.67 210.85,83.37 215.85,88.37 218.55,94.9
  region: 35.44,0 35.44,4.67 33.02,13.68 28.36,21.76 21.76,28.36 13.68,33.02 4.67,35.44 -4.67,35.44 -13.68,33.02 -21.76,28.36 -28.36,21.76 -33.02,13.68 -35.44,4.67 -35.44,0 -35.44,-4.67 -33.02,-13.68 -28.36,-21.76 -21.76,-28.36 -13.68,-33.02 -4.67,-35.44 4.67,-35.44 13.68,-33.02 21.76,-28.36 28.36,-21.76 33.02,-13.68 35.44,-4.67
  lines w2: -528.64,-158.57 564.05,-158.57 564.05,1107.33 -528.64,1107.33 -528.64,-158.57